# Altium footprint library goldpin_male_pcb.PcbLib: 157 footprints (part 1 of 10)
Each footprint in its own frame and in the unit in brackets; x right, y up, seen from the top. Pads: shape width x height; smd on the part's side, far side on the other; paste and mask are expansions set on the pad; w line width, h text height; cw(c..) or ccw(c..) is an arc to the next point about the centre after c.
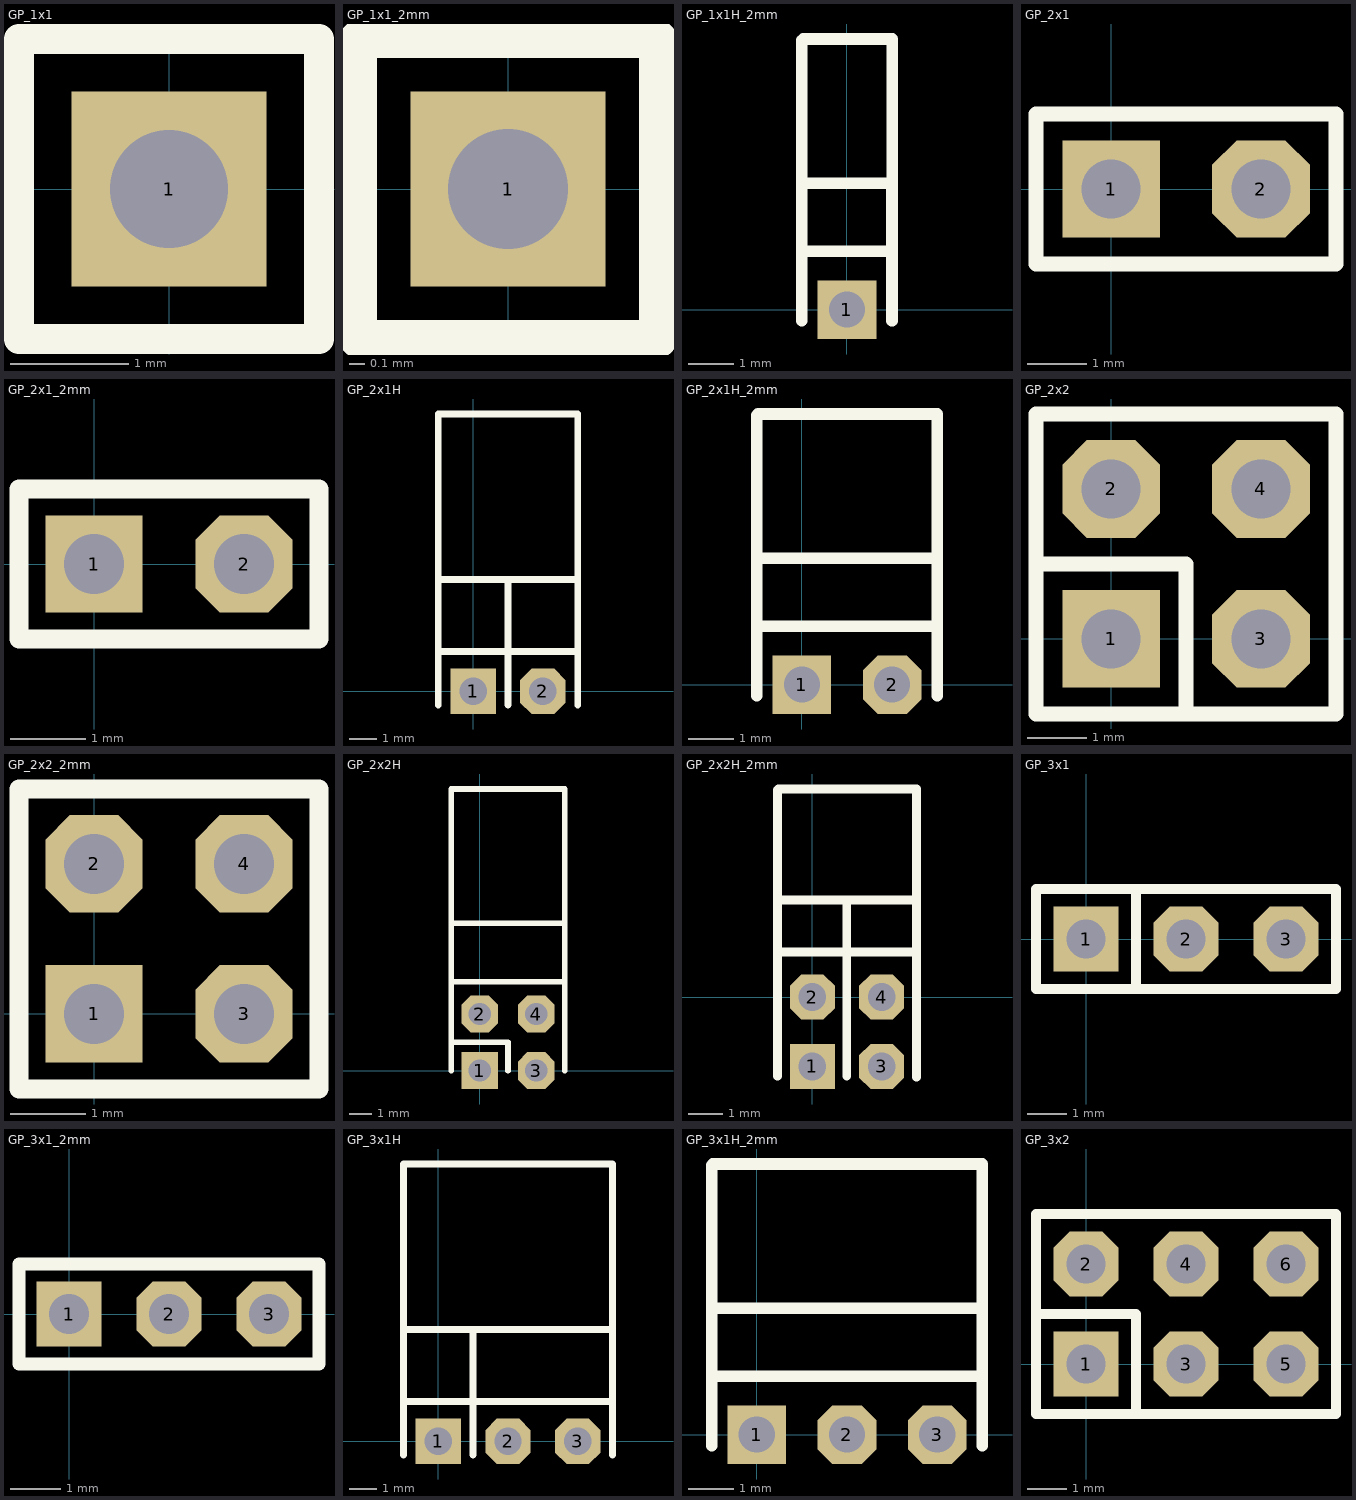
[diagram p0: the footprints below, top view; thin cyan lines are the x and y axes]

## GP_1x1 [mil]
pads (1):
  rect 65x65 hole 39.37: 1(0,0)
Top Overlay:
  lines w10: -50,-50 -50,-19.68 -50,50 50,50 50,-50 -50,-50
3D body "Samtec-TSW-101-23-F-S.STEP": height 330, standoff -115, extent -50,-50 50,50

## GP_1x1_2mm [mm]
height 4.45
pads (1):
  rect 1.3x1.3 hole 0.8: 1(0,0)
Top Overlay:
  lines w0.254: -1,-1 -1,1 1,1 1,-1 -1,-1
3D body "Samtec-TMM-101-03-G-S.STEP": height 5.51, standoff -2.69, extent -1,-0.99 1,0.991

## GP_1x1H_2mm [mm]
height 4.45
pads (1):
  rect 1.3x1.3 hole 0.8: 1(0,0)
Top Overlay:
  lines w0.254: -1,-0.25 -1,1.822 -1,5.973 ; -1,1.3 0.95,1.3 ; -1,2.8 0.95,2.8 ; 0.99,-0.25 0.99,2.8
  lines w0.256: -1,5.973 -0.973,6 1,6 1,-0.25
3D body "Samtec-TMM-101-03-G-S-RA.STEP": height 1.99, standoff -3.04, extent -1,-0.25 1,5.973

## GP_2x1 [mil]
pads (2):
  rect 65x65 hole 39.37: 1(0,0)
  oct 65x65 hole 39.37: 2(100,0)
Top Overlay:
  lines w10: -50,-50 -50,-19.68 -50,50 150,50 150,-50 -50,-50
3D body "Samtec-TSW-102-23-F-S.STEP": height 330, standoff -115, extent -50,-50 150,50

## GP_2x1_2mm [mm]
height 4.45
pads (2):
  rect 1.3x1.3 hole 0.8: 1(0,0)
  oct 1.3x1.3 hole 0.8: 2(2,0)
Top Overlay:
  lines w0.254: -1,-1 3,-1 3,1 -1,1 -1,-1
3D body "Samtec-TMM-102-03-G-S.STEP": height 5.51, standoff -2.69, extent -1,-0.99 3,0.991

## GP_2x1H [mil]
pads (2):
  rect 65x65 hole 39.37: 1(0,0)
  oct 65x65 hole 39.37: 2(100,0)
Top Overlay:
  lines w10: -50,-19.68 -50,80.31 -50,397.64 150,397.64 150,280.31 150,-19.68 ; -50,57.24 150,57.24 ; -50,160.51 150,160.51 ; 50,-19.68 50,80.31 50,160.51
3D body "tsw-102-08-x-s-ra.STEP": height 119.87, standoff -89.13, extent -50,-12.69 150,389.81

## GP_2x1H_2mm [mm]
height 4.45
pads (2):
  rect 1.3x1.3 hole 0.8: 1(0,0)
  oct 1.3x1.3 hole 0.8: 2(2,0)
Top Overlay:
  lines w0.254: -1,-0.25 -1,1.822 -1,5.973 ; -1,1.3 3,1.3 ; -1,2.8 3,2.8
  lines w0.256: -1,5.973 -0.973,6 3,6 3,-0.25
3D body "Samtec-TMM-102-03-G-S-RA.STEP": height 1.99, standoff -3.04, extent -1,-0.25 3,5.973

## GP_2x2 [mil]
pads (4):
  rect 65x65 hole 39.37: 1(0,0)
  oct 65x65 hole 39.37: 2(0,100) 3(100,0) 4(100,100)
Top Overlay:
  lines w10: -50,50 50,50 50,-50 ; -50,-50 -50,0 -50,150 150,150 150,-50 -50,-50
3D body "Samtec-TSW-102-23-F-S.STEP": height 330, standoff -115, extent -50,-50 150,50
3D body "Samtec-TSW-102-23-F-S.STEP": height 330, standoff -115, extent -50,50 150,150

## GP_2x2_2mm [mm]
height 4.45
pads (4):
  rect 1.3x1.3 hole 0.8: 1(0,0)
  oct 1.3x1.3 hole 0.8: 2(0,2) 3(2,0) 4(2,2)
Top Overlay:
  lines w0.254: -1,-1 3,-1 3,2.999 -1,2.999 -1,-1
3D body "Samtec-TMM-102-03-G-D.STEP": height 6.51, standoff -1.69, extent -1,-0.968 3,2.969

## GP_2x2H [mil]
pads (4):
  rect 65x65 hole 39.37: 1(0,0)
  oct 65x65 hole 39.37: 2(0,100) 3(100,0) 4(100,100)
Top Overlay:
  lines w10: -50,0 -50,180.31 -50,497.64 150,497.64 150,380.31 150,0 ; -50,50 50,50 50,0 ; -50,157.24 150,157.24 ; -50,260.51 150,260.51
3D body "Samtec-TSW-102-08-F-D-RA.STEP": height 220.08, standoff -89.92, extent -49,-14 151,488.5

## GP_2x2H_2mm [mm]
height 4.45
pads (4):
  rect 1.3x1.3 hole 0.8: 1(0,-2)
  oct 1.3x1.3 hole 0.8: 2(0,0) 3(2,-2) 4(2,0)
Top Overlay:
  lines w0.254: -1,-2.275 -1,1.822 -1,5.973 ; -1,1.3 3,1.3 ; -1,2.8 3,2.8 ; 0.99,-2.275 0.99,2.775 ; 3,-2.3 3,6
  lines w0.256: -1,5.973 -0.973,6 3,6
3D body "Samtec-TMM-102-03-G-D-RA.STEP": height 3.97, standoff -3.02, extent -1.025,-2.261 2.975,5.961

## GP_3x1 [mil]
pads (3):
  rect 65x65 hole 39.37: 1(0,0)
  oct 65x65 hole 39.37: 2(100,0) 3(200,0)
Top Overlay:
  lines w10: 50,-50 50,50 ; -50,-50 250,-50 250,50 -50,50 -50,-19.68 -50,-50
3D body "Samtec-TSW-103-23-F-S.STEP": height 330, standoff -115, extent -50,-50 250,50

## GP_3x1_2mm [mm]
height 4.45
pads (3):
  rect 1.3x1.3 hole 0.8: 1(0,0)
  oct 1.3x1.3 hole 0.8: 2(2,0) 3(4,0)
Top Overlay:
  lines w0.254: -1,-1 5,-1 5,1 -1,1 -1,-1
3D body "Samtec-TMM-103-03-G-S.STEP": height 5.51, standoff -2.69, extent -1,-0.99 5,0.991

## GP_3x1H [mil]
pads (3):
  rect 65x65 hole 39.37: 1(0,0)
  oct 65x65 hole 39.37: 2(100,0) 3(200,0)
Top Overlay:
  lines w10: -50,-19.68 -50,80.31 -50,397.64 250,397.64 250,180.31 250,-19.68 ; -50,57.24 250,57.24 ; -50,160.51 250,160.51 ; 50,-19.68 50,80.31 50,160
3D body "Samtec-TSW-103-08-F-S-RA.STEP": height 120.87, standoff -89.13, extent -49,-13 251,389.5

## GP_3x1H_2mm [mm]
height 4.45
pads (3):
  rect 1.3x1.3 hole 0.8: 1(0,0)
  oct 1.3x1.3 hole 0.8: 2(2,0) 3(4,0)
Top Overlay:
  lines w0.254: -1,-0.25 -1,1.822 -1,5.973 ; -1,1.3 5,1.3 ; -1,2.8 5,2.8
  lines w0.256: -1,5.973 -0.973,6 5,6 5,-0.25
3D body "Samtec-TMM-103-03-G-S-RA.STEP": height 1.99, standoff -3.04, extent -1,-0.25 5,5.973

## GP_3x2 [mil]
pads (6):
  rect 65x65 hole 39.37: 1(0,0)
  oct 65x65 hole 39.37: 2(0,100) 3(100,0) 4(100,100) 5(200,0) 6(200,100)
Top Overlay:
  lines w10: -50,50 50,50 50,-50 ; -50,-50 -50,150 250,150 250,-50 -50,-50
3D body "Samtec-TSW-103-23-F-D.STEP": height 330, standoff -115, extent -50,-50 250,150